# Altium footprint library 5-C-THD.PcbLib: 166 footprints (part 4 of 11)
Each footprint in its own frame and in the unit in brackets; x right, y up, seen from the top. Pads: shape width x height; smd on the part's side, far side on the other; paste and mask are expansions set on the pad; w line width, h text height; cw(c..) or ccw(c..) is an arc to the next point about the centre after c.
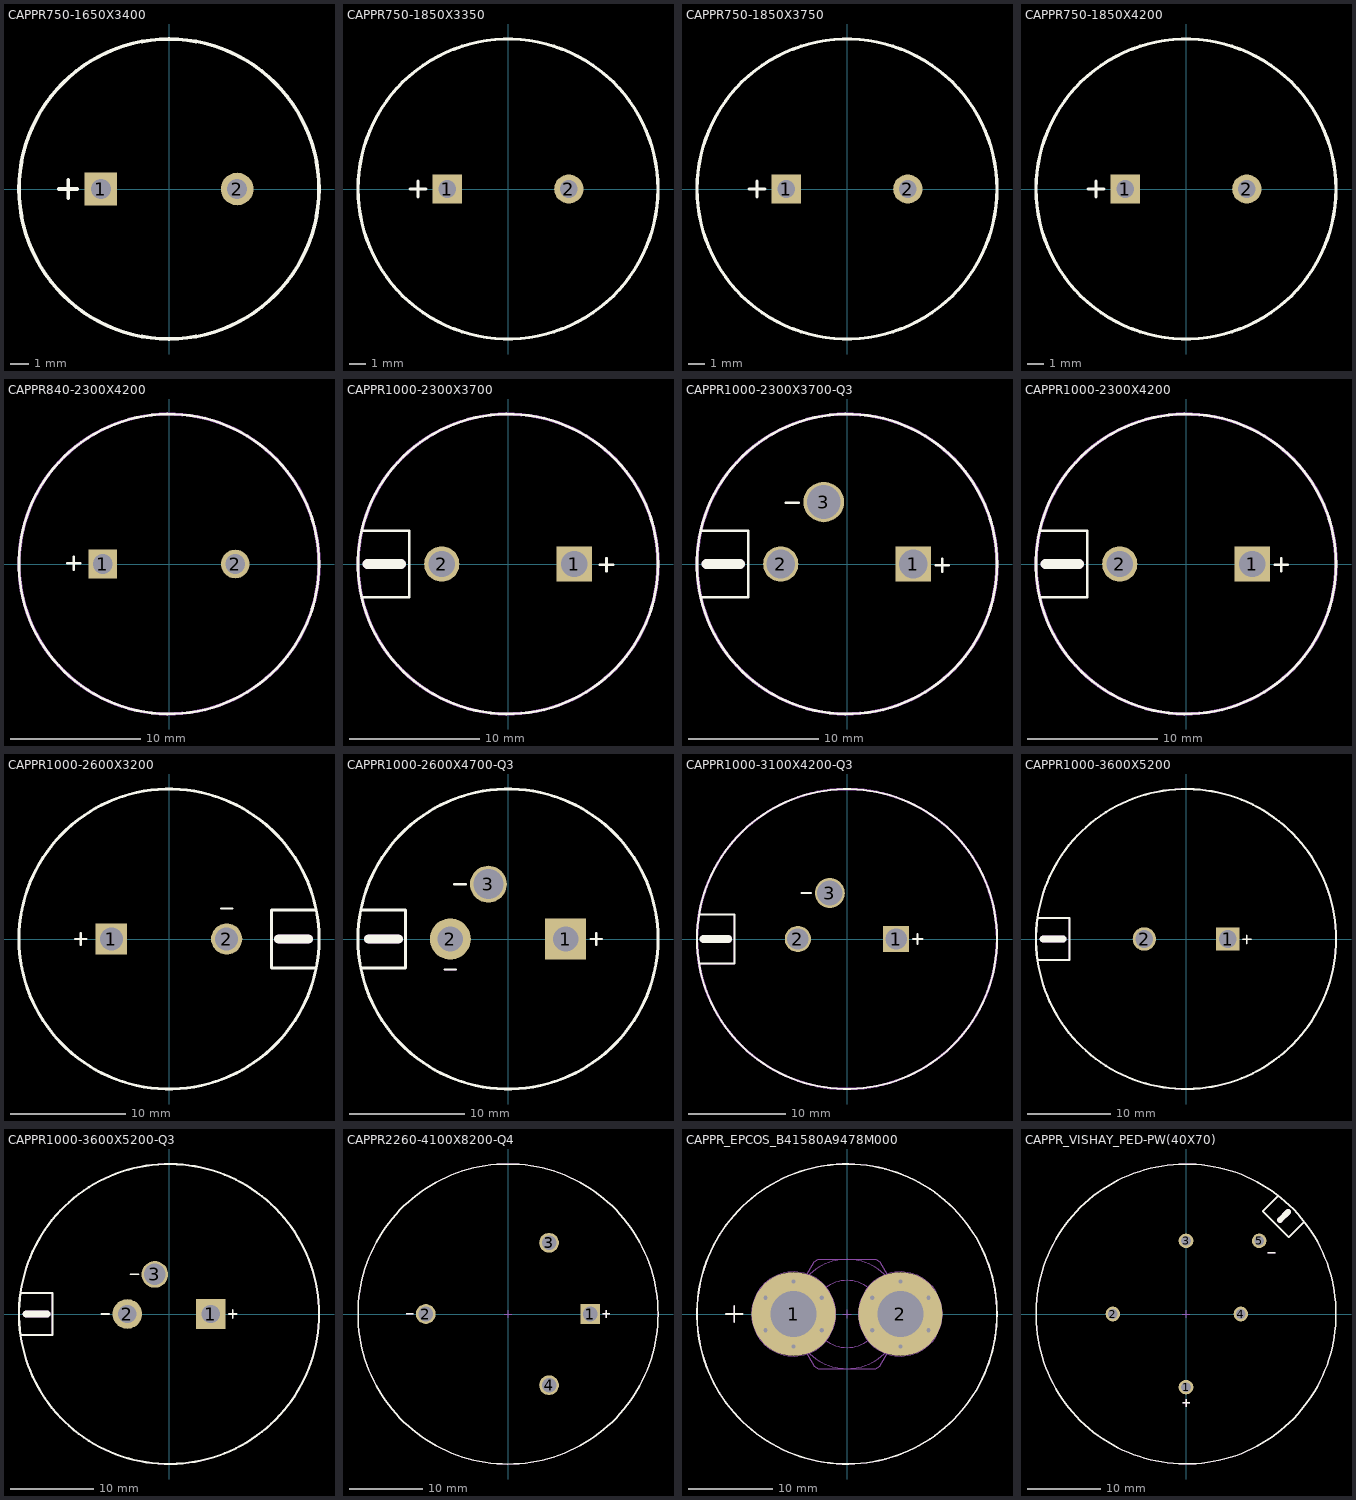
[diagram p3: the footprints below, top view; thin cyan lines are the x and y axes]

## CAPPR750-1650X3400 [mm] "Capacitor, Radial, Pin spacing 7.5mm - Body Diameter 16.5mm X Body  Height 34mm"
height 34
pads (2):
  rect 1.8x1.8 hole 1.1: 1(-3.75,0)
  round 1.8 hole 1.1: 2(3.75,0)
Top Overlay:
  circle w0.2: c0,0 r8.25
  lines w0.2: -6.05,0 -5.05,0 ; -5.55,-0.5 -5.55,0.5
Mechanical 13:
  circle w0.1: c0,0 r8.25
Mechanical 14:
  circle w0.1: c0,0 r8.25
  lines w0.1: -6.05,0 -5.05,0 ; -5.55,-0.5 -5.55,0.5
3D body "CAPPR750-1650X3400.stp": height 34, standoff -3.6, extent -8.25,-8.25 8.25,8.25

## CAPPR750-1850X3350 [mm] "Capacitor, Radial, Pin spacing 7.5mm - Body Diameter 18.5mm X Body  Height 33.0mm"
height 33.5
pads (2):
  rect 1.8x1.8 hole 1.1: 1(-3.75,0)
  round 1.8 hole 1.1: 2(3.75,0)
Top Overlay:
  circle w0.2: c0,0 r9.25
  lines w0.2: -6.05,0 -5.05,0 ; -5.55,-0.5 -5.55,0.5
Mechanical 13:
  circle w0.1: c0,0 r9.25
Mechanical 14:
  circle w0.1: c0,0 r9.25
  lines w0.1: -6.05,0 -5.05,0 ; -5.55,-0.5 -5.55,0.5
3D body "CAPPR750-1850X3350.stp": height 33.5, standoff -3.6, extent -9.25,-9.25 9.25,9.25

## CAPPR750-1850X3750 [mm] "Capacitor, Radial, Pin spacing 7.5mm - Body Diameter 18.5mm X Body  Height 37.5mm"
height 37.5
pads (2):
  rect 1.8x1.8 hole 1.1: 1(-3.75,0)
  round 1.8 hole 1.1: 2(3.75,0)
Top Overlay:
  circle w0.2: c0,0 r9.25
  lines w0.2: -6.05,0 -5.05,0 ; -5.55,-0.5 -5.55,0.5
Mechanical 13:
  circle w0.1: c0,0 r9.25
Mechanical 14:
  circle w0.1: c0,0 r9.25
  lines w0.1: -6.05,0 -5.05,0 ; -5.55,-0.5 -5.55,0.5
3D body "CAPPR750-1850X3750.stp": height 37.5, standoff -3.6, extent -9.25,-9.25 9.25,9.25

## CAPPR750-1850X4200 [mm] "Capacitor, Radial, Pin spacing 7.5mm - Body Diameter 18.5mm X Body  Height 42mm"
height 42.5
pads (2):
  rect 1.8x1.8 hole 1.1: 1(-3.75,0)
  round 1.8 hole 1.1: 2(3.75,0)
Top Overlay:
  circle w0.2: c0,0 r9.25
  lines w0.2: -6.05,0 -5.05,0 ; -5.55,-0.5 -5.55,0.5
Mechanical 13:
  circle w0.1: c0,0 r9.25
Mechanical 14:
  circle w0.1: c0,0 r9.25
  lines w0.1: -6.05,0 -5.05,0 ; -5.55,-0.5 -5.55,0.5
3D body "CAPPR750-1850X4200.stp": height 42, standoff -3.6, extent -9.25,-9.226 9.25,9.274

## CAPPR840-2300X4200 [mm] "Capacitor, Radial, Pins spacing 8.4mm - Body Diameter 23mm X Body  Height 42mm"
height 42
pads (2):
  rect 2.2x2.2 hole 1.5: 1(-5.08,0)
  round 2.2 hole 1.5: 2(5.08,0)
Top Overlay:
  circle w0.2: c0,0 r11.5
  lines w0.2: -7.8,0.05 -6.8,0.05 ; -7.3,-0.45 -7.3,0.55
Mechanical 13:
  circle w0.254: c0,0 r11.5
Mechanical 14:
  circle w0.1: c0,0 r11.5
  lines w0.1: -7.8,0.05 -6.8,0.05 ; -7.3,-0.45 -7.3,0.55
3D body "CAPPR1000-2300X4200.stp": height 42, standoff -4, extent -11.5,-11.5 11.5,11.5

## CAPPR1000-2300X3700 [mm] "Capacitor, Radial, Pins spacing 10mm - Body Diameter 22mm X Body  Height 35mm"
height 37
pads (2):
  rect 2.7x2.7 hole 2: 1(5.08,0)
  round 2.7 hole 2: 2(-5.08,0)
Top Overlay:
  circle w0.2: c0,0 r11.5
  lines w0.2: -11.131,-2.54 -7.575,-2.54 -7.575,2.54 -11.131,2.54 ; 7.05,-0.05 8.05,-0.05 ; 7.55,-0.55 7.55,0.45
  lines w0.8: -10.75,0 -8.21,0
Mechanical 13:
  circle w0.254: c0,0 r11.5
Mechanical 14:
  circle w0.1: c0,0 r11.5
  lines w0.1: -11.131,-2.54 -7.575,-2.54 -7.575,2.54 -11.131,2.54 ; 7.05,-0.05 8.05,-0.05 ; 7.55,-0.55 7.55,0.45
  lines w0.8: -10.75,0 -8.21,0
3D body "CAPPR1000-2300X3700.stp": height 37, standoff -4, extent -11.5,-11.5 11.5,11.5

## CAPPR1000-2300X3700-Q3 [mm] "Capacitor, Radial, 3 Pins spacing 10mm and 4.75mm - Body Diameter 23mm X Body  Height 37mm"
height 37
pads (3):
  rect 2.7x2.7 hole 2.2: 1(5.08,0)
  round 2.7 hole 2.2: 2(-5.08,0)
  round 3.1 hole 2.6: 3(-1.78,4.75)
Top Overlay:
  circle w0.2: c0,0 r11.5
  lines w0.2: -11.131,-2.54 -7.575,-2.54 -7.575,2.54 -11.131,2.54 ; -4.7,4.7 -3.7,4.7 ; 6.8,-0.1 7.8,-0.1 ; 7.3,-0.6 7.3,0.4
  lines w0.8: -10.75,0 -8.21,0
Mechanical 13:
  circle w0.254: c0,0 r11.5
Mechanical 14:
  circle w0.1: c0,0 r11.5
  lines w0.1: -11.131,-2.54 -7.575,-2.54 -7.575,2.54 -11.131,2.54 ; -4.7,4.7 -3.7,4.7 ; 6.8,-0.1 7.8,-0.1 ; 7.3,-0.6 7.3,0.4
  lines w0.8: -10.75,0 -8.21,0
3D body "CAPPR1000-2300X3700-Q3.stp": height 37, standoff -4, extent -11.5,-11.5 11.5,11.5

## CAPPR1000-2300X4200 [mm] "Capacitor, Radial, Pins spacing 10mm - Body Diameter 23mm X Body  Height 42mm"
height 42
pads (2):
  rect 2.7x2.7 hole 2: 1(5.08,0)
  round 2.7 hole 2: 2(-5.08,0)
Top Overlay:
  circle w0.2: c0,0 r11.5
  lines w0.2: -11.131,-2.54 -7.575,-2.54 -7.575,2.54 -11.131,2.54 ; 6.8,-0.05 7.8,-0.05 ; 7.3,-0.55 7.3,0.45
  lines w0.8: -10.75,0 -8.21,0
Mechanical 13:
  circle w0.254: c0,0 r11.5
Mechanical 14:
  circle w0.1: c0,0 r11.5
  lines w0.1: -11.131,-2.54 -7.575,-2.54 -7.575,2.54 -11.131,2.54 ; 6.8,-0.05 7.8,-0.05 ; 7.3,-0.55 7.3,0.45
  lines w0.8: -10.75,0 -8.21,0
3D body "CAPPR1000-2300X4200.stp": height 42, standoff -4, extent -11.5,-11.5 11.5,11.5

## CAPPR1000-2600X3200 [mm] "Capacitor, Radial, Pins spacing 10mm - Body Diameter 26.0mm X Body  Height 32.0mm"
height 32
pads (2):
  rect 2.7x2.7 hole 2: 1(-5,0)
  round 2.7 hole 2: 2(5,0)
Top Overlay:
  circle w0.254: c0,0 r13
  lines w0.2: -8.15,0 -7.15,0 ; -7.65,-0.5 -7.65,0.5 ; 4.5,2.65 5.5,2.65
  lines w0.254: 12.65,-2.5 8.9,-2.5 8.9,2.5 12.65,2.5
  lines w0.8: 9.519,0 10.154,0 11.424,0 12.059,0
Mechanical 14:
  circle w0.1: c0,0 r13
  lines w0.1: -8.15,0 -7.15,0 ; -7.65,-0.5 -7.65,0.5 ; 4.5,2.65 5.5,2.65 ; 12.65,-2.5 8.9,-2.5 8.9,2.5 12.65,2.5
  lines w0.8: 9.519,0 12.059,0
3D body "CAPPR1000-2600X3200.stp": height 32, standoff -4, extent -13,-13 13,13

## CAPPR1000-2600X4700-Q3 [mm] "Capacitor, Radial, 3 Pins spacing 10mm and 4.75mm - Body Diameter 26.0mm X Body  Height 47.0mm"
height 47
pads (3):
  rect 3.556x3.556 hole 2.2: 1(5,0)
  round 3.556 hole 2.2: 2(-5,0)
  round 3.2 hole 2.6: 3(-1.7,4.75)
Top Overlay:
  circle w0.254: c0,0 r13
  lines w0.2: -5.5,-2.65 -4.5,-2.65 ; -4.65,4.75 -3.65,4.75 ; 7.15,0 8.15,0 ; 7.65,-0.5 7.65,0.5
  lines w0.254: -12.65,-2.5 -8.9,-2.5 -8.9,2.5 -12.65,2.5
  lines w0.8: -12.059,0 -11.424,0 -10.154,0 -9.519,0
Mechanical 14:
  circle w0.1: c0,0 r13
  lines w0.1: -12.65,-2.5 -8.9,-2.5 -8.9,2.5 -12.65,2.5 ; -5.5,-2.65 -4.5,-2.65 ; -4.65,4.75 -3.65,4.75 ; 7.15,0 8.15,0 ; 7.65,-0.5 7.65,0.5
  lines w0.8: -12.059,0 -9.519,0
3D body "CAPPR1000-2600X4700-Q3.stp": height 47, standoff -4, extent -13,-13 13,13

## CAPPR1000-3100X4200-Q3 [mm] "Capacitor, Radial, 3 Pins spacing 10mm and 4.75mm - Body Diameter 31mm X Body  Height 42mm"
height 42
pads (3):
  rect 2.7x2.7 hole 2.2: 1(5.08,0)
  round 2.7 hole 2.2: 2(-5.08,0)
  round 3.1 hole 2.6: 3(-1.78,4.75)
Top Overlay:
  circle w0.2: c0,0 r15.5
  lines w0.2: -15.2,-2.54 -11.644,-2.54 -11.644,2.54 -15.2,2.54 ; -4.7,4.75 -3.7,4.75 ; 6.8,0 7.8,0 ; 7.3,-0.5 7.3,0.5
  lines w0.8: -14.819,0 -12.279,0
Mechanical 13:
  circle w0.254: c0,0 r15.5
Mechanical 14:
  lines w0.1: -15.2,-2.54 -11.644,-2.54 -11.644,2.54 -15.2,2.54 ; -4.7,4.75 -3.7,4.75 ; 6.8,0 7.8,0 ; 7.3,-0.5 7.3,0.5
  lines w0.8: -14.819,0 -12.279,0
3D body "CAPPR1000-3100X4200-Q3.stp": height 42, standoff -4, extent -15.5,-15.457 15.5,15.543

## CAPPR1000-3600X5200 [mm] "Capacitor, Radial, Leads spacing 10mm - Body Diameter 35.0mm X Body  Height 50.0mm"
height 52
pads (2):
  rect 2.8x2.8 hole 2.1: 1(5,0)
  round 2.8 hole 2.1: 2(-5,0)
Top Overlay:
  circle w0.254: c0,0 r18
  lines w0.2: 6.8,-0.05 7.8,-0.05 ; 7.3,-0.55 7.3,0.45
  lines w0.254: -17.75,-2.5 -14,-2.5 -14,2.5 -17.75,2.5
  lines w0.8: -17.159,0 -14.725,0
Mechanical 14:
  circle w0.1: c0,0 r18
  lines w0.1: -17.75,-2.5 -14,-2.5 -14,2.5 -17.75,2.5 ; 6.8,-0.05 7.8,-0.05 ; 7.3,-0.55 7.3,0.45
  lines w0.8: -17.159,0 -14.725,0
3D body "CAPPR1000-3600X5200.stp": height 52, standoff -4, extent -18,-18 18,18

## CAPPR1000-3600X5200-Q3 [mm] "Capacitor, Radial, 3 Pins spacing 10mm and 4.75mm - Body Diameter 36.0mm X Body  Height 52.0mm"
height 52
pads (3):
  rect 3.556x3.556 hole 2.2: 1(5,0)
  round 3.556 hole 2.2: 2(-5,0)
  round 3.2 hole 2.6: 3(-1.7,4.75)
Top Overlay:
  circle w0.254: c0,0 r18
  lines w0.2: -8.15,0 -7.15,0 ; -4.65,4.75 -3.65,4.75 ; 7.15,0 8.15,0 ; 7.65,-0.5 7.65,0.5
  lines w0.254: -17.75,-2.5 -14,-2.5 -14,2.5 -17.75,2.5
  lines w0.8: -17.159,0 -14.619,0
Mechanical 14:
  circle w0.1: c0,0 r18
  lines w0.1: -17.75,-2.5 -14,-2.5 -14,2.5 -17.75,2.5 ; -8.15,0 -7.15,0 ; -4.65,4.75 -3.65,4.75 ; 7.15,0 8.15,0 ; 7.65,-0.5 7.65,0.5
  lines w0.8: -17.159,0 -14.619,0
3D body "CAPPR1000-3600X5200-Q3.stp": height 52, standoff -4, extent -18,-18 18,18

## CAPPR2260-4100X8200-Q4 [mm] "Capacitor, Radial, 4 Pins spacing 22.6mm - Body Diameter 41mm X Body  Height 82mm"
height 82
pads (4):
  rect 2.7x2.7 hole 2: 1(11.25,0)
  round 2.7 hole 2: 2(-11.25,0) 3(5.625,9.743) 4(5.625,-9.743)
Top Overlay:
  circle w0.2: c0,0 r20.524
  lines w0.2: -13.95,0 -12.95,0 ; 12.95,0 13.95,0 ; 13.45,-0.5 13.45,0.5
Mechanical 8:
  lines w0.1: -11.75,0 -11.25,0 ; -11.25,-0.5 -11.25,0 ; -11.25,0.5 -11.25,0 ; -10.75,0 -11.25,0 ; -0.5,0 0,0 ; 0,-0.5 0,0 ; 0,0.5 0,0 ; 0.5,0 0,0 ; 5.125,-9.743 5.625,-9.743 ; 5.125,9.743 5.625,9.743 ; 5.625,-10.243 5.625,-9.743 ; 5.625,-9.243 5.625,-9.743 ; 5.625,9.243 5.625,9.743 ; 5.625,10.243 5.625,9.743 ; 6.125,-9.743 5.625,-9.743 ; 6.125,9.743 5.625,9.743 ; 10.75,0 11.25,0 ; 11.25,-0.5 11.25,0 ; 11.25,0.5 11.25,0 ; 11.75,0 11.25,0
Mechanical 14:
  circle w0.1: c0,0 r20.524
  lines w0.1: -13.95,0 -12.95,0 ; 12.95,0 13.95,0 ; 13.45,-0.5 13.45,0.5
3D body "CAPPR2260-4100X8200-Q4.stp": height 82, standoff -4, extent -20.5,-20.5 20.5,20.5

## CAPPR_EPCOS_B41580A9478M000 [mm] "Radial Capacitor with Screw Terminals, Leads spacing 12.7mm - Body Diameter 35.7mm X Body  Height 106.7mm"
height 126.2
pads (2):
  round 10 hole 5.5: 1(-6.35,0) 2(6.35,0)
via -9.706,1.938 diameter 1 hole 0.5
via -6.35,3.875 diameter 1 hole 0.5
via -2.994,1.938 diameter 1 hole 0.5
via -2.994,-1.938 diameter 1 hole 0.5
via -6.35,-3.875 diameter 1 hole 0.5
via -9.706,-1.938 diameter 1 hole 0.5
via 2.994,1.938 diameter 1 hole 0.5
via 6.35,3.875 diameter 1 hole 0.5
via 9.706,1.938 diameter 1 hole 0.5
via 9.706,-1.938 diameter 1 hole 0.5
via 6.35,-3.875 diameter 1 hole 0.5
via 2.994,-1.938 diameter 1 hole 0.5
Top Overlay:
  circle w0.2: c0,0 r17.85
  lines w0.2: -14.425,0 -12.425,0 ; -13.425,-1 -13.425,1
Mechanical 8:
  circle w0.1: c-6.35,0 r2.75
  circle w0.1: c-6.35,0 r5
  circle w0.1: c6.35,0 r2.75
  circle w0.1: c6.35,0 r5
  lines w0.1: -10.139,-2.188 -9.706,-1.938 ; -10.139,2.188 -9.706,1.938 ; -9.956,-1.504 -9.706,-1.938 ; -9.956,1.504 -9.706,1.938 ; -9.456,-2.371 -9.706,-1.938 ; -9.456,2.371 -9.706,1.938 ; -9.273,-1.687 -9.706,-1.938 ; -9.273,1.687 -9.706,1.938 ; -6.85,-3.875 -6.35,-3.875 ; -6.85,3.875 -6.35,3.875 ; -6.35,-4.375 -6.35,-3.875 ; -6.35,-3.375 -6.35,-3.875 ; -6.35,3.375 -6.35,3.875 ; -6.35,4.375 -6.35,3.875 ; -5.85,-3.875 -6.35,-3.875 ; -5.85,3.875 -6.35,3.875 ; -3.427,-1.687 -2.994,-1.938 ; -3.427,1.687 -2.994,1.938 ; -3.244,-2.371 -2.994,-1.938 ; -3.244,2.371 -2.994,1.938 ; -2.744,-1.504 -2.994,-1.938 ; -2.744,1.504 -2.994,1.938 ; -2.561,-2.188 -2.994,-1.938 ; -2.561,2.188 -2.994,1.938 ; -0.5,0 0,0 ; 0,-0.5 0,0 ; 0,0.5 0,0 ; 0.5,0 0,0 ; 2.561,-2.188 2.994,-1.938 ; 2.561,2.188 2.994,1.938 ; 2.744,-1.504 2.994,-1.938 ; 2.744,1.504 2.994,1.938 ; 3.244,-2.371 2.994,-1.938 ; 3.244,2.371 2.994,1.938 ; 3.427,-1.687 2.994,-1.938 ; 3.427,1.687 2.994,1.938 ; 5.85,-3.875 6.35,-3.875 ; 5.85,3.875 6.35,3.875 ; 6.35,-4.375 6.35,-3.875 ; 6.35,-3.375 6.35,-3.875 ; 6.35,3.375 6.35,3.875 ; 6.35,4.375 6.35,3.875 ; 6.85,-3.875 6.35,-3.875 ; 6.85,3.875 6.35,3.875 ; 9.273,-1.687 9.706,-1.938 ; 9.273,1.687 9.706,1.938 ; 9.456,-2.371 9.706,-1.938 ; 9.456,2.371 9.706,1.938 ; 9.956,-1.504 9.706,-1.938 ; 9.956,1.504 9.706,1.938 ; 10.139,-2.188 9.706,-1.938 ; 10.139,2.188 9.706,1.938 ; -6.35,0 -6.35,0.5 -6.35,0 ; -6.35,0 -6.85,0 -6.35,0 ; -6.35,0 -6.35,-0.5 -6.35,0 ; -6.35,0 -5.85,0 -6.35,0 ; 6.35,0 6.35,0.5 6.35,0 ; 6.35,0 5.85,0 6.35,0 ; 6.35,0 6.35,-0.5 6.35,0 ; 6.35,0 6.85,0 6.35,0
Mechanical 14:
  circle w0.1: c0,0 r4
  circle w0.1: c0,0 r6.5
  circle w0.1: c0,0 r17.85
  lines w0.1: -14.425,0 -12.425,0 ; -13.425,-1 -13.425,1 ; -7.339,-0.288 -3.919,-6.212 -3.42,-6.5 3.42,-6.5 3.919,-6.212 7.339,-0.288 7.339,0.288 3.919,6.212 3.42,6.5 -3.42,6.5 -3.919,6.212 -7.339,0.288 -7.339,-0.288
3D body "CAPPR_EPCOS_B41580A9478M000_Part1.stp": height 126.2, standoff 0, extent -17.85,-17.85 17.85,17.85
3D body "CAPPR_EPCOS_B41580A9478M000_Part2.stp": height 10.4, standoff -5.27, extent -11.1,-4.75 11.1,4.75

## CAPPR_VISHAY_PED-PW(40X70) [mm] "Capacitor, Radial, 5 Leads - Body Diameter 40.0mm X Body  Height 70mm"
height 75
pads (5):
  round 2 hole 1.3: 1(0,-10) 2(-10,0) 3(0,10) 4(7.5,0) 5(10,10)
Top Overlay:
  circle w0.2: c0,0 r20.5
  lines w0.2: -0.475,-12.15 0.525,-12.15 ; 0.025,-12.65 0.025,-11.65 ; 11.175,8.4 12.175,8.4
  lines w0.254: 12.595,16.13 10.494,14.03 14.03,10.494 16.13,12.595
  lines w0.8: 12.834,12.834 13.965,13.965
Mechanical 8:
  lines w0.1: -10.5,0 -10,0 ; -10,-0.5 -10,0 ; -10,0.5 -10,0 ; -9.5,0 -10,0 ; -0.5,-10 0,-10 ; -0.5,0 0,0 ; -0.5,10 0,10 ; 0,-10.5 0,-10 ; 0,-9.5 0,-10 ; 0,-0.5 0,0 ; 0,0.5 0,0 ; 0,9.5 0,10 ; 0,10.5 0,10 ; 0.5,-10 0,-10 ; 0.5,0 0,0 ; 0.5,10 0,10 ; 7,0 7.5,0 ; 7.5,-0.5 7.5,0 ; 7.5,0.5 7.5,0 ; 8,0 7.5,0 ; 9.5,10 10,10 ; 10,9.5 10,10 ; 10,10.5 10,10 ; 10.5,10 10,10
Mechanical 14:
  circle w0.1: c0,0 r20.5
  lines w0.1: -0.475,-12.15 0.525,-12.15 ; 0.025,-12.65 0.025,-11.65 ; 11.175,8.4 12.175,8.4 ; 12.622,16.157 10.494,14.03 14.03,10.494 16.157,12.622
  lines w0.8: 12.834,12.834 13.965,13.965
3D body "CAPPR_VISHAY_PED-PW(40X70).stp": height 75, standoff -4, extent -20.5,-20.5 20.5,20.5